# Altium footprint library Component.PcbLib: 115 footprints (part 1 of 8)
Each footprint in its own frame and in the unit in brackets; x right, y up, seen from the top. Pads: shape width x height; smd on the part's side, far side on the other; paste and mask are expansions set on the pad; w line width, h text height; cw(c..) or ccw(c..) is an arc to the next point about the centre after c.
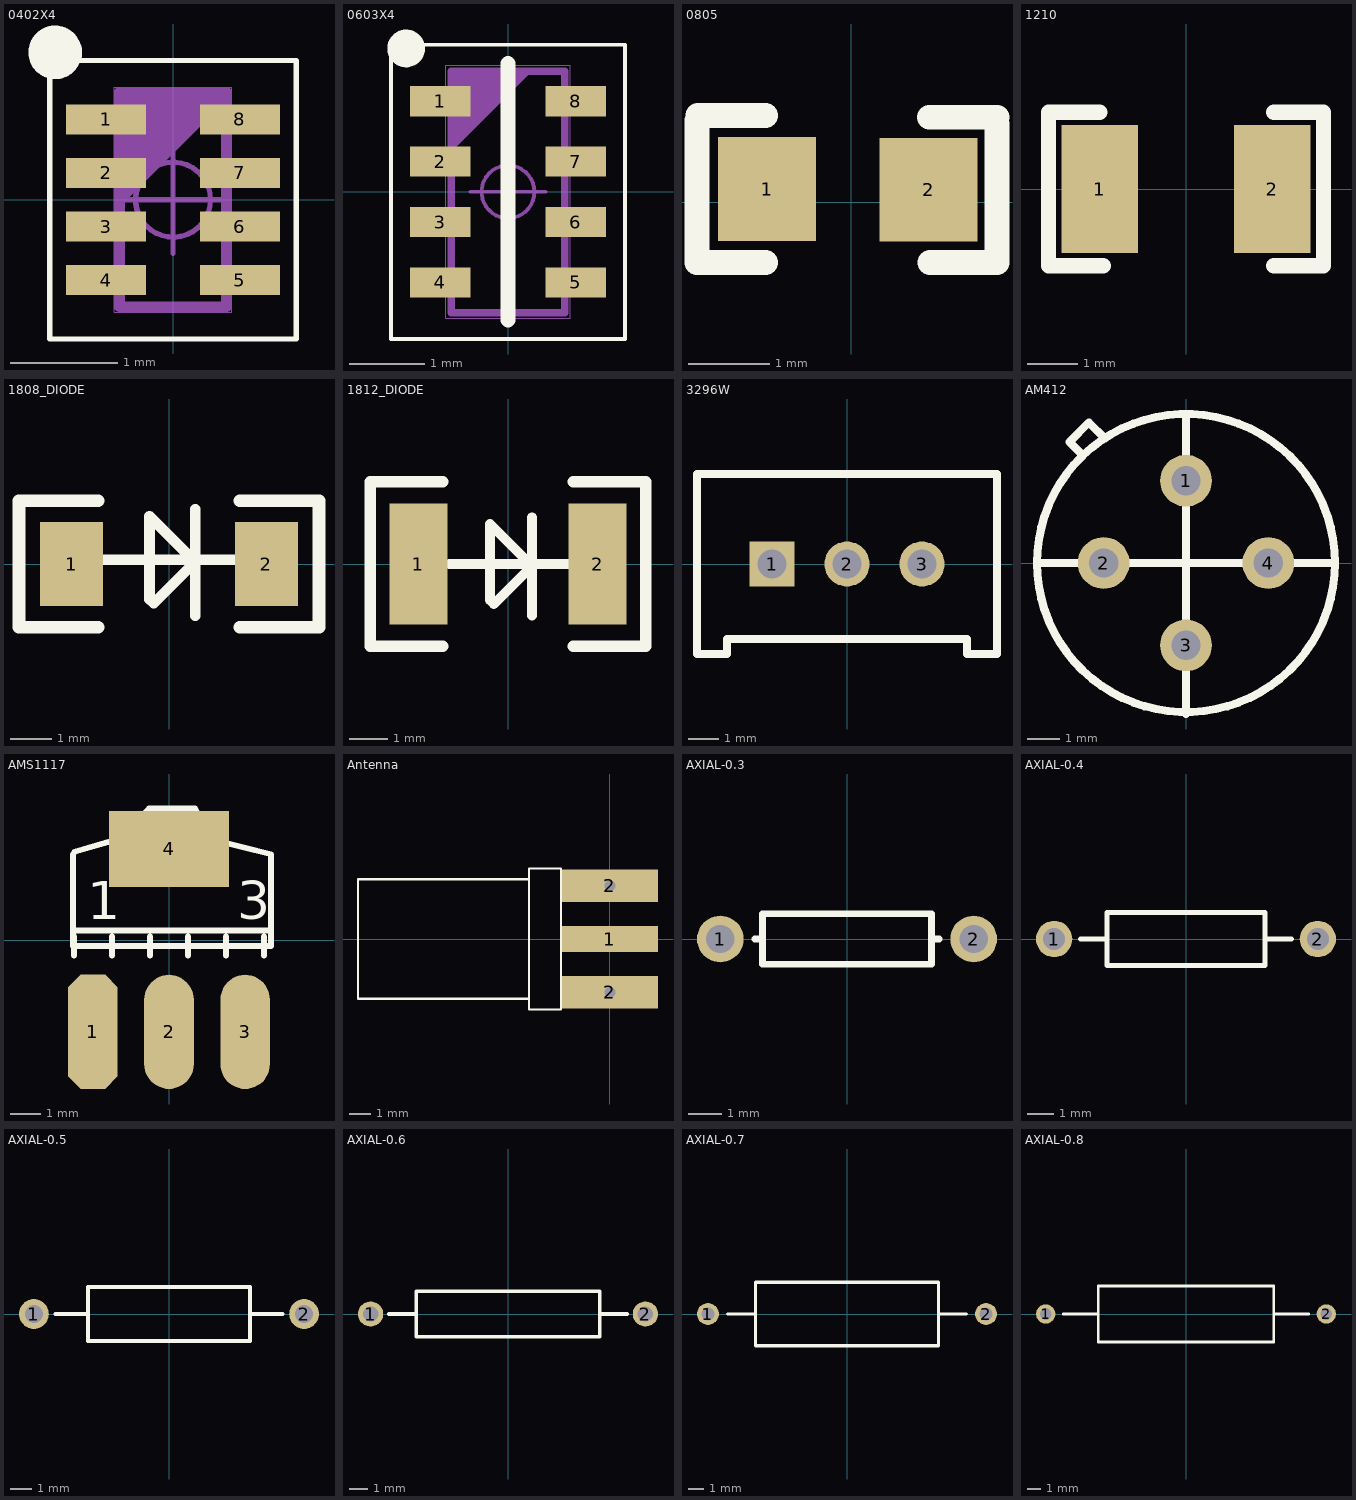
[diagram p0: the footprints below, top view; thin cyan lines are the x and y axes]

## 0402X4 [mm]
pads (8):
  rect 0.75x0.28 smd: 1(-0.625,0.75) 2(-0.625,0.25) 3(-0.625,-0.25) 4(-0.625,-0.75) 5(0.625,-0.75) 6(0.625,-0.25) 7(0.625,0.25) 8(0.625,0.75)
Top Overlay:
  circle w0.25: c-1.1,1.375 r0.125
  lines w0.05: -1.15,-1.3 1.15,-1.3 1.15,1.3 -1.15,1.3 -1.15,-1.3
Mechanical 1:
  lines w0.1: 0.5,1 0.5,-1 -0.5,-1 -0.5,1 0.5,1 ; 0.5,1 -0.5,0 0.5,1 ; -0.5,0.1 0.4,1 -0.5,0.1 ; -0.5,0.2 0.3,1 -0.5,0.2 ; -0.5,0.3 0.2,1 -0.5,0.3 ; -0.5,0.4 0.1,1 -0.5,0.4 ; -0.5,0.5 0,1 -0.5,0.5 ; -0.5,0.6 -0.1,1 -0.5,0.6 ; -0.5,0.7 -0.2,1 -0.5,0.7 ; -0.5,0.8 -0.3,1 -0.5,0.8 ; -0.5,0.9 -0.4,1 -0.5,0.9
  text "R1" at 0.18,-0.199 h0.3
Mechanical 16:
  circle w0.05: c0,0 r0.35
  lines w0.001: -0.55,-1.05 0.55,-1.05 0.55,1.05 -0.55,1.05 -0.55,-1.05
  lines w0.05: -0.5,0 0.5,0 ; 0,-0.5 0,0.5

## 0603X4 [mm]
pads (8):
  rect 0.8x0.4 smd: 1(-0.9,1.2) 2(-0.9,0.4) 3(-0.9,-0.4) 4(-0.9,-1.2) 5(0.9,-1.2) 6(0.9,-0.4) 7(0.9,0.4) 8(0.9,1.2)
Top Overlay:
  circle w0.25: c-1.35,1.9 r0.125
  lines w0.05: -1.55,-1.95 1.55,-1.95 1.55,1.95 -1.55,1.95 -1.55,-1.95
  lines w0.2: 0,-1.7 0,1.7
Mechanical 1:
  lines w0.1: -0.75,-1.6 0.75,-1.6 0.75,1.6 -0.75,1.6 -0.75,-1.6 ; -0.75,0.6 0.25,1.6 -0.75,0.6 ; -0.75,0.7 0.15,1.6 -0.75,0.7 ; -0.75,0.8 0.05,1.6 -0.75,0.8 ; -0.75,0.9 -0.05,1.6 -0.75,0.9 ; -0.75,1 -0.15,1.6 -0.75,1 ; -0.75,1.1 -0.25,1.6 -0.75,1.1 ; -0.75,1.2 -0.35,1.6 -0.75,1.2 ; -0.75,1.3 -0.45,1.6 -0.75,1.3 ; -0.75,1.4 -0.55,1.6 -0.75,1.4 ; -0.75,1.5 -0.65,1.6 -0.75,1.5
  text "R1" at 0.33,-0.365 h0.55
Mechanical 16:
  circle w0.05: c0,0 r0.35
  lines w0.001: -0.825,-1.675 0.825,-1.675 0.825,1.675 -0.825,1.675 -0.825,-1.675
  lines w0.05: -0.5,0 0.5,0 ; 0,-0.5 0,0.5

## 0805 [mm]
pads (2):
  rect 1.2x1.27 smd: 1(-1.03,0.165) 2(0.95,0.155)
Top Overlay:
  lines w0.305: -1.89,-0.735 -1.89,1.005 ; -1.88,1.065 -1.05,1.065 ; -1.86,-0.735 -1.05,-0.735 ; 0.96,1.045 1.79,1.045 ; 0.97,-0.735 1.79,-0.735 1.79,0.965
3D body: height 0.5, standoff 0, extent -1.02,-0.46 0.98,0.79

## 1210 [mil]
height 78.35
pads (2):
  rect 60x100 smd: 1(-67.5,0) 2(67.5,0)
Top Overlay:
  lines w12: -67.5,60.24 -107.66,60.24 -107.66,-60.24 -64.74,-60.24 ; 68.72,-60.24 107.7,-60.24 107.7,60.24 68.72,60.24

## 1808_DIODE [mil]
height 78.35
pads (2):
  rect 60x80 smd: 1(-92.5,0) 2(92.5,0)
Top Overlay:
  lines w10: -60.85,3.94 63.17,3.94 ; 23.8,3.94 22.82,3.94 -18.52,45.28 -18.52,-33.47 -14.59,-37.4 24.78,1.97 ; 24.78,-49.21 24.78,52.17
  lines w12: -67.5,-60 -142.5,-60 -142.5,60 -67.5,60 ; 67.5,-60 142.5,-60 142.5,60 67.5,60
3D body: height 78.74, standoff 0, extent -64.94,-47.24 53.17,51.18
3D body: height 19.68, standoff 0, extent -21.63,-35.43 25.61,43.31
3D body: height 19.68, standoff 0, extent 21.67,-51.18 29.55,55.12
3D body: height 39.37, standoff 0, extent 49.23,-47.24 80.73,51.18
3D body: height 39.37, standoff 0, extent -80.69,-47.24 -64.94,51.18

## 1812_DIODE [mil]
height 78.35
pads (2):
  rect 60x125 smd: 1(-92.5,0) 2(92.5,0)
Top Overlay:
  lines w10: -60.85,0 63.17,0 ; 23.8,0 22.82,0 -18.52,41.34 -18.52,-37.4 -14.59,-41.34 24.78,-1.97 ; 24.78,-53.15 24.78,48.23
  lines w12: -67.5,-85 -142.5,-85 -142.5,85 -67.5,85 ; 67.5,-85 142.5,-85 142.5,85 67.5,85

## 3296W [mm]
pads (3):
  rect 1.5x1.5 hole 0.95: 1(-2.5,0)
  round 1.5 hole 0.95: 2(0,0) 3(2.5,0)
Top Overlay:
  lines w0.254: -5,-3 -4,-3 -4,-2.5 4,-2.5 4,-3 5,-3 5,3 -5,3 -5,-3
3D body: height 12.67, standoff -3.6, extent -4.9,-2.475 4.9,2.475

## AM412 [mm]
height 1.99
pads (4):
  round 1.6 hole 0.9: 1(0,2.54) 2(-2.54,0) 3(0,-2.54) 4(2.54,0)
Top Overlay:
  circle w0.254: c0,0 r4.6
  lines w0.25: -4.6,0 4.54,0 ; -3.2,3.34 -3.6,3.74 -3,4.34 ; -2.5,3.84 -3,4.34 ; 0,-4.66 0,4.54 ; -3,4.34 -3,4.34
3D body: height 10, standoff 5, extent -4.704,-4.671 4.46,4.511
3D body: height 6, standoff 5, extent -3.64,3.38 -2.43,4.39
3D body: height 5, standoff -1, extent 2.044,-0.499 3.04,0.499
3D body: height 5, standoff -1, extent -0.496,2.041 0.5,3.039
3D body: height 5, standoff -1, extent -3.036,-0.499 -2.04,0.499
3D body: height 5, standoff -1, extent -0.496,-3.039 0.5,-2.041

## AMS1117 [mil]
height 78.35
pads (4):
  oct 65x150 smd: 1(-100,-120)
  oval 65x150 smd: 2(0,-120) 3(100,-120)
  rect 157.48x100 smd: 4(0,120)
Top Overlay:
  lines w7.87: -126,113 -126,13 ; -125,-20 -125,5 ; -124.33,116.33 -66,133 -26,173 34,173 54,133 134,113 134,-7 ; -75,-20 -75,5 ; -25,-20 -25,5 ; 25,-20 25,5 ; 75,-20 75,5 ; 125,-20 125,5 ; -126,13 134,13 134,-7 ; -126,13 -126,-7 134,-7
  text "3" at 89.26,27.46 h50
  text "1" at -107.59,27.46 h50

## Antenna [mm]
pads (3):
  rect 4.5x1.2 smd: 1(0,0)
  rect 4.5x1.524 hole 0.5: 2(0,-2.5) 2(0,2.5)
Top Overlay:
  lines w0.1: -3.8,-2.8 -11.8,-2.8 -11.8,2.8 -3.8,2.8 ; -3.8,-3.3 -3.8,3.3 -2.3,3.3 -2.3,-3.3 -3.8,-3.3
3D body: height 4.5, standoff -4.5, extent -26.543,-4.889 -8.293,41.973
3D body: height 4.6, standoff -3.32, extent -12.489,-4.76 1.781,4.76

## AXIAL-0.3 [mm] "Axial Device, Thru-Hole; 2 Leads; 0.3 in Pin Spacing"
height 1.524
pads (2):
  round 1.4 hole 0.85: 1(-3.81,0) 2(3.81,0)
Top Overlay:
  lines w0.2: -2.769,0 -2.54,0 ; 2.769,0 2.54,0 ; 2.54,0 2.54,-0.762 -2.54,-0.762 -2.54,0.762 2.54,0.762 2.54,0

## AXIAL-0.4 [mm] "Axial Device, Thru-Hole; 2 Leads; 0.4 in Pin Spacing"
height 2.032
pads (2):
  round 1.4 hole 0.85: 1(-5.08,0) 2(5.08,0)
Top Overlay:
  lines w0.2: -4.064,0 -3.048,0 ; 3.048,0 4.064,0 ; -3.048,-1.016 -3.048,1.016 3.048,1.016 3.048,-1.016 -3.048,-1.016

## AXIAL-0.5 [mm] "Axial Device, Thru-Hole; 2 Leads; 0.5 in Pin Spacing"
height 2.54
pads (2):
  round 1.4 hole 0.85: 1(-6.35,0) 2(6.35,0)
Top Overlay:
  lines w0.2: -5.334,0 -3.81,0 ; 3.81,0 5.334,0 ; -3.81,-1.27 3.81,-1.27 3.81,1.27 -3.81,1.27 -3.81,-1.27

## AXIAL-0.6 [mm] "Axial Device, Thru-Hole; 2 Leads; 0.6 in Pin Spacing"
height 2.54
pads (2):
  round 1.4 hole 0.85: 1(-7.62,0) 2(7.62,0)
Top Overlay:
  lines w0.2: -6.604,0 -5.08,0 ; 5.08,0 6.604,0 ; -5.08,-1.27 -5.08,1.27 5.08,1.27 5.08,-1.27 -5.08,-1.27

## AXIAL-0.7 [mm] "Axial Device, Thru-Hole; 2 Leads; 0.7 in Pin Spacing"
height 4.064
pads (2):
  round 1.4 hole 0.85: 1(-8.89,0) 2(8.89,0)
Top Overlay:
  lines w0.2: -7.62,0 -5.842,0 ; 5.842,0 7.62,0 ; -5.842,-2.032 5.842,-2.032 5.842,2.032 -5.842,2.032 -5.842,-2.032

## AXIAL-0.8 [mm] "Axial Device, Thru-Hole; 2 Leads; 0.8 in Pin Spacing"
height 4.064
pads (2):
  round 1.4 hole 0.85: 1(-10.16,0) 2(10.16,0)
Top Overlay:
  lines w0.2: -8.89,0 -6.35,0 ; 6.35,0 8.89,0 ; -6.35,-2.032 -6.35,2.032 6.35,2.032 6.35,-2.032 -6.35,-2.032